# Altium footprint library 我的元件库02.PcbLib: 300 footprints (part 1 of 19)
Each footprint in its own frame and in the unit in brackets; x right, y up, seen from the top. Pads: shape width x height; smd on the part's side, far side on the other; paste and mask are expansions set on the pad; w line width, h text height; cw(c..) or ccw(c..) is an arc to the next point about the centre after c.
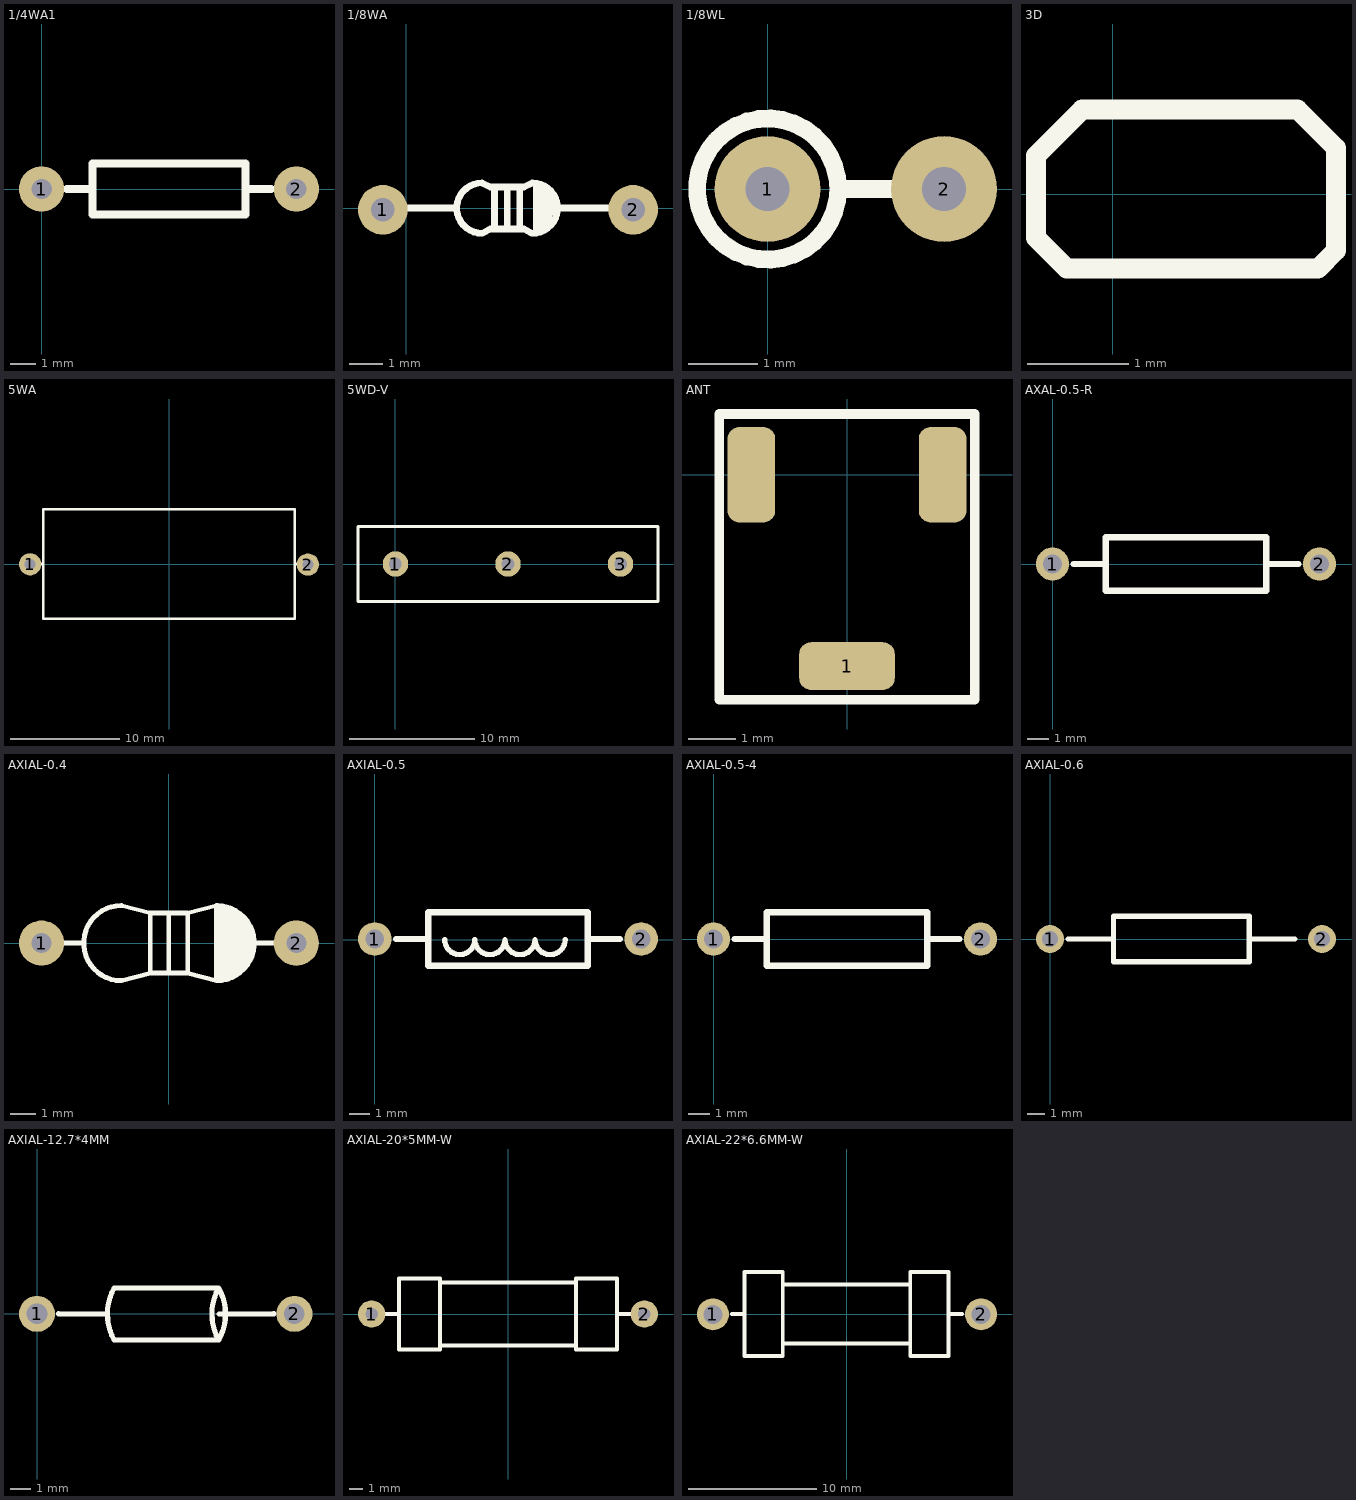
[diagram p0: the footprints below, top view; thin cyan lines are the x and y axes]

## 1/4WA1 [mm]
pads (2):
  round 1.8 hole 0.813: 1(0,0) 2(10.16,0)
Top Overlay:
  lines w0.305: 1.016,0 2.032,0 ; 8.128,0 9.144,0 ; 2.032,-1.016 8.128,-1.016 8.128,1.016 2.032,1.016 2.032,-1.016
3D body: height 2, standoff -3.26, extent -0.351,-1.225 10.409,1.295

## 1/8WA [mm]
pads (2):
  round 1.5 hole 0.7: 1(-0.711,-0.051) 2(6.858,-0.051)
Top Overlay:
  lines w0.203: 0,0 1.524,0 ; 2.667,-0.635 2.667,0.635 ; 3.048,-0.635 3.048,0.635 ; 3.429,-0.635 3.429,0.635 ; 3.937,-0.635 3.937,0.635 ; 4.064,-0.635 4.064,0.635 ; 4.191,-0.635 4.191,0.508 ; 4.318,-0.381 4.318,0.381 ; 4.445,-0.127 4.445,0.254 ; 4.572,0 6.096,0 ; 2.286,-0.762 cw(c2.286,0) 2.286,0.762 2.54,0.635 3.556,0.635 3.81,0.762 cw(c3.81,0) 3.81,-0.762 3.556,-0.635 2.54,-0.635 2.286,-0.762
3D body: height 2.42, standoff -3.48, extent -0.952,-0.914 7.048,0.886

## 1/8WL [mil]
pads (2):
  round 60 hole 25: 1(0,0) 2(100,0)
Top Overlay:
  circle w10: c0,0 r40
  lines w10: 40,0 70,0
3D body: height 285.43, standoff -59.06, extent -36.08,-37 110.08,35.48

## 3D [mm]
Top Overlay:
  lines w0.2: -0.762,-0.432 -0.457,-0.737 2.032,-0.737 2.21,-0.559 2.21,0.457 1.829,0.838 -0.305,0.838 -0.762,0.381 -0.762,-0.432
3D body: height 28, standoff -2, extent -18.898,-18.694 -9.278,-15.084
3D body: height 8.16, standoff -3.73, extent 5.486,-17.831 23.266,-12.751
3D body: height 1.73, standoff -0.08, extent 8.484,35.408 14.484,40.408
3D body: height 1.55, standoff 0, extent 33.071,32.436 39.071,41.086
3D body: height 7.49, standoff -7.49, extent 50.825,-20.396 66.637,-4.039
3D body: height 1.2, standoff 0, extent 53.162,-0.711 59.162,5.289
3D body: height 2, standoff -2, extent 51.46,16.18 55.464,17.08
3D body: height 1.11, standoff -0.4, extent 6.198,-2.667 9.398,-1.067
3D body: height 2.75, standoff -2.75, extent -16.637,-0.914 -5.037,0.696
3D body: height 2.25, standoff -2.25, extent -7.111,-15.895 0.889,-14.275
3D body: height 2.5, standoff -2.5, extent -11.47,11.796 -4.47,13.106
3D body: height 1.61, standoff -1.61, extent -6.248,3.861 -1.238,4.981
3D body: height 0.6, standoff -0.6, extent -0.102,3.988 1.498,4.348
3D body: height 5.08, standoff -4.13, extent 3.429,1.524 11.328,20.828
3D body: height 0.42, standoff -0.39, extent -0.84,-4.547 2.16,-2.507
3D body: height 1.56, standoff 0, extent 16.332,8.001 25.332,17.001

## 3D1 [mm]
3D body: height 0.43, standoff -0.43, extent -1.104,-0.203 0.596,0.247

## 5WA [mil]
pads (2):
  round 80 hole 39.37: 1(-500,-1) 2(500,-2)
Top Overlay:
  lines w10: -490.5,0 -452.76,0 ; 452.76,0 488.5,0 ; -452.76,-196.85 -452.76,196.85 452.76,196.85 452.76,-196.85 -452.76,-196.85
3D body: height 362.6, standoff -98.43, extent -519.68,-193 519.68,188.89

## 5WD-V [mil]
pads (3):
  round 80 hole 39.37: 1(0,0) 2(354.33,0) 3(708.66,0)
Top Overlay:
  lines w10: -118.11,-118.11 826.77,-118.11 826.77,118.11 -118.11,118.11 -118.11,-118.11

## ANT [mm]
pads (3):
  rrect50% 2x1 smd: 1(0,-4)
  rrect50% 1x2 smd: ""(-2,0) ""(2,0)
Top Overlay:
  lines w0.2: -2.667,-4.699 2.667,-4.699 2.667,1.27 -2.667,1.27 -2.667,-4.699

## AXAL-0.5-R [mil]
pads (2):
  round 62 hole 35.43: 1(-0.24,0.14) 2(499.76,0.14)
Top Overlay:
  lines w12: 39.76,0.14 99.76,0.14 ; 399.76,0.14 459.76,0.14 ; 99.76,-49.85 399.76,-49.85 399.76,50.15 99.76,50.15 99.76,-49.85
3D body: height 19.68, standoff -161.56, extent -15,-56 515,56.5

## AXIAL-0.4 [mm]
pads (2):
  round 1.8 hole 0.8: 1(-5.08,0)
  oval 1.8x1.81 hole 0.8: 2(5.08,0)
Top Overlay:
  lines w0.178: -1.9,-1.5 -0.75,-1.2 -0.75,1.2 -1.9,1.5 ; 0,-1.185 0,1.115 ; 0.75,-1.2 1.9,-1.5 ; 0.75,-1.1 0.75,1.2 1.9,1.5
  lines w0.2: -4.826,0 -3.5,0 ; -1.9,-1.5 cw(c-1.9,0) -1.9,1.5 ; -0.75,-1.2 0.75,-1.2 ; -0.75,1.2 0.75,1.2 ; 1.9,-1.5 ccw(c1.9,0) 1.9,1.5 ; 2.823,-1.041 2.823,0.959 ; 2.95,-0.991 2.95,0.889 ; 3.052,-0.813 3.052,0.716 ; 3.15,-0.563 3.15,0.58 ; 3.277,-0.432 3.277,0.33 ; 3.5,0 5,0
  lines w0.254: 1.93,-1.422 1.93,1.473 ; 2.134,-1.422 2.134,1.448 ; 2.362,-1.397 2.362,1.346 ; 2.54,-1.27 2.54,1.295 ; 2.718,-1.194 2.718,1.194
Bottom Overlay:
  lines w0.254: -5,0 -1.778,0 -1.524,1.016 -1.27,0 -1.016,-1.016 -0.787,0 -0.508,1.016 -0.254,0 0,-1.016 0.254,0 0.508,1.016 0.762,0 1.016,-1.016 1.27,0 5,0
3D body: height 3.12, standoff -2.06, extent -5.385,-1.118 5.334,1.118

## AXIAL-0.5 [mm]
pads (2):
  round 1.6 hole 0.9: 1(0.012,0.024) 2(12.712,0.024)
Top Overlay:
  lines w0.254: 3.342,0.001 ccw(c4.061,0.001) 4.779,0.001 ccw(c5.497,0.001) 6.216,0.001 ccw(c6.934,0.001) 7.653,0.001 ccw(c8.371,0.001) 9.09,0.001
  lines w0.305: 1.028,0.024 2.552,0.024 ; 10.172,0.024 11.696,0.024 ; 2.552,-1.246 10.172,-1.246 10.172,1.294 2.552,1.294 2.552,-1.246
3D body: height 0.5, standoff -4.1, extent -0.381,-1.422 13.081,1.435

## AXIAL-0.5-4 [mil]
pads (2):
  round 62 hole 35.43: 1(-0.07,0.38) 2(499.93,0.38)
Top Overlay:
  lines w12: 39.93,0.38 99.93,0.38 ; 399.93,0.38 459.93,0.38 ; 99.93,-49.62 99.93,50.38 399.93,50.38 399.93,-49.62 99.93,-49.62
3D body: height 19.68, standoff -161.56, extent -13,-57 517,55.5

## AXIAL-0.6 [mil]
pads (2):
  round 62 hole 35.43: 1(0.06,0.8) 2(600.06,0.8)
Top Overlay:
  lines w12: 40.06,0.8 140.06,0.8 ; 440.06,0.8 540.06,0.8 ; 140.06,-49.2 140.06,50.8 440.06,50.8 440.06,-49.2 140.06,-49.2

## AXIAL-12.7*4MM [mil]
height 196.85
pads (2):
  round 70 hole 40: 1(0,0) 2(500,0)
Top Overlay:
  lines w10: 41.9,0.1 137,0 ; 354,-0.03 459.88,0.12 ; 352.86,50.46 ccw(c443.74,-0.15) 353,-51 ; 352.86,50.46 cw(c262.12,-0.4) 353,-51 ; 352.86,50.46 149.86,50.46 ccw(c240.74,-0.15) 150,-51 353,-51
3D body: height 161.42, standoff -51.18, extent -6,-64 509.75,61.98

## AXIAL-20*5MM-W [mm] "2W电阻"
height 10
pads (2):
  round 2 hole 0.9: 1(-10,0) 2(10,0)
Top Overlay:
  lines w0.3: -5,-2.6 -5,-2 -5,2 -5,2.6 ; -5,-2.3 5,-2.3 ; -5,2.3 5,2.3 ; 5,-2.6 5,-2 5,2 5,2.6
  lines w0.305: -8.983,0 -8,0 ; -5,-2.6 -8,-2.6 -8,2.6 -5,2.6 ; 5,-2.6 8,-2.6 8,2.6 5,2.6 ; 8,0 9.068,0
3D body: height 5.8, standoff -1.4, extent -10.425,-2.515 10.375,2.485

## AXIAL-22*6.6MM-W [mm] "2W电阻"
height 10
pads (2):
  round 2.5 hole 1.5: 1(-10.465,-0.025) 2(10.541,-0.025)
Top Overlay:
  lines w0.3: -5,-3.3 -5,3.3 ; -5,-2.6 -5,-2 ; -5,-2.3 5,-2.3 ; -5,2 -5,2.6 ; -5,2.3 5,2.3 ; 5,-3.3 5,3.3 ; 5,-2.6 5,-2 ; 5,2 5,2.6
  lines w0.305: -8.983,0 -8,0 ; -5,-3.3 -8,-3.3 -8,3.3 -5,3.3 ; 5,-3.3 8,-3.3 8,3.3 5,3.3 ; 8,0 9.068,0
3D body: height 8.3, standoff -2, extent -10.998,-3.249 11.202,3.351